# Altium footprint library 1.10-电容.PcbLib: 188 footprints (part 2 of 12)
Each footprint in its own frame and in the unit in brackets; x right, y up, seen from the top. Pads: shape width x height; smd on the part's side, far side on the other; paste and mask are expansions set on the pad; w line width, h text height; cw(c..) or ccw(c..) is an arc to the next point about the centre after c.
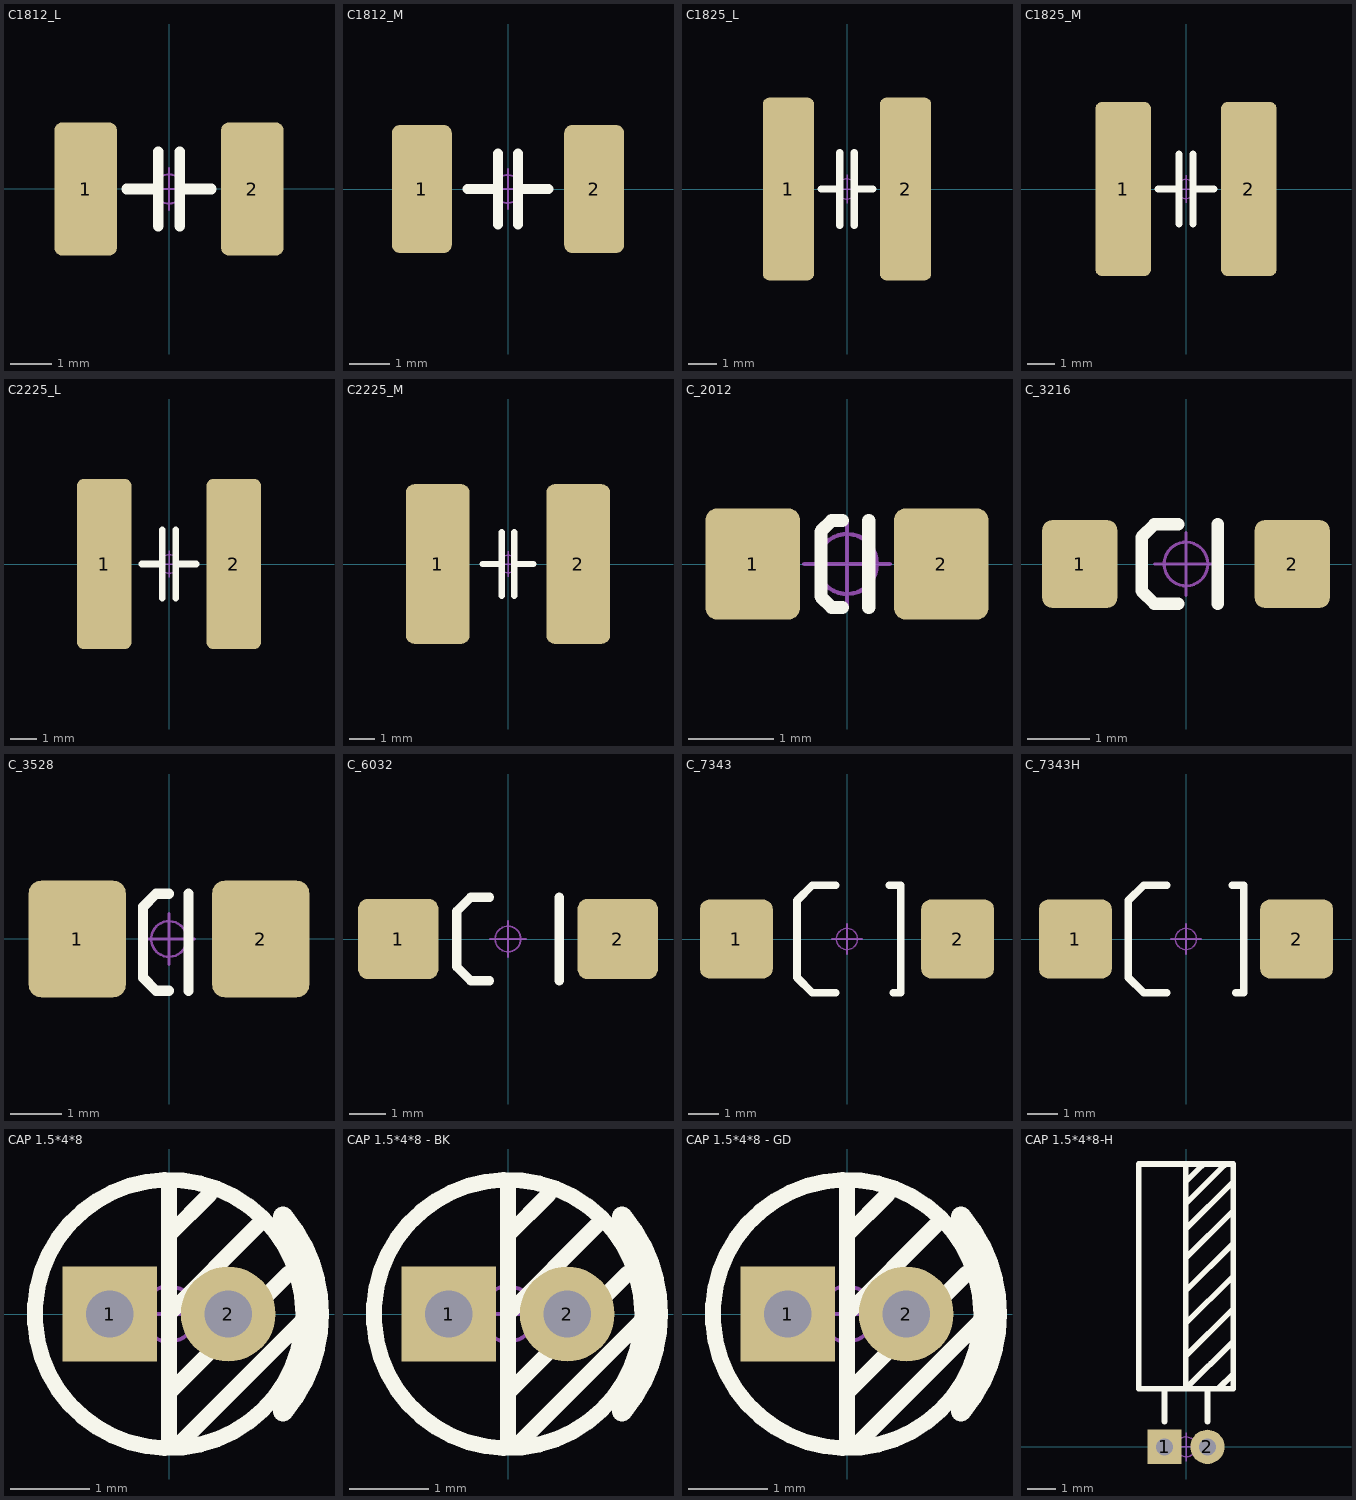
[diagram p1: the footprints below, top view; thin cyan lines are the x and y axes]

## C1812_L [mm] "无极性贴片电容                  淘宝ID:黄晶宝石"
pads (2):
  rrect25% 1.5x3.2 smd: 1(-2,0) 2(2,0)
Top Overlay:
  lines w0.254: -1.016,0 -0.254,0 ; -0.254,-0.889 -0.254,0.889 ; 0.254,-0.889 0.254,0.889 ; 0.254,0 1.016,0
Mechanical 15:
  circle w0.05: c0,0 r0.35
  lines w0.05: -0.5,0 0.5,0 ; 0,-0.5 0,0.5
3D body "C 1812.STEP": height 2.06, standoff 0.04, extent -2.3,-1.61 2.3,1.61

## C1812_M [mm] "无极性贴片电容                  淘宝ID:黄晶宝石"
pads (2):
  rrect25% 1.5x3.2 smd: 1(-2.159,0) 2(2.159,0)
Top Overlay:
  lines w0.254: -1.016,0 -0.254,0 ; -0.254,-0.889 -0.254,0.889 ; 0.254,-0.889 0.254,0.889 ; 0.254,0 1.016,0
Mechanical 15:
  circle w0.05: c0,0 r0.35
  lines w0.05: -0.5,0 0.5,0 ; 0,-0.5 0,0.5
3D body "C 1812.STEP": height 2.06, standoff 0.04, extent -2.3,-1.61 2.3,1.61

## C1825_L [mil] "无极性贴片电容                  淘宝ID:黄晶宝石"
pads (2):
  rrect25% 70x250 smd: 1(-80,0) 2(80,0)
Top Overlay:
  lines w10: -35,0 -10,0 ; -10,-50 -10,50 ; 10,-50 10,50 ; 10,0 35,0
Mechanical 15:
  circle w1.97: c0,0 r13.78
  lines w1.97: -19.68,0 19.68,0 ; 0,-19.68 0,19.68
3D body "C 1825.STEP": height 65.39, standoff 1.61, extent -88.58,-125.39 88.59,125.4

## C1825_M [mil] "无极性贴片电容                  淘宝ID:黄晶宝石"
pads (2):
  rrect25% 80x250 smd: 1(-90,0) 2(90,0)
Top Overlay:
  lines w10: -40,0 -10,0 ; -10,-50 -10,50 ; 10,-50 10,50 ; 10,0 40,0
Mechanical 15:
  circle w1.97: c0,0 r13.78
  lines w1.97: -19.68,0 19.68,0 ; 0,-19.68 0,19.68
3D body "C 1825.STEP": height 65.39, standoff 1.61, extent -88.58,-125.39 88.59,125.4

## C2225_L [mil] "无极性贴片电容                  淘宝ID:黄晶宝石"
pads (2):
  rrect25% 80x250 smd: 1(-95,0) 2(95,0)
Top Overlay:
  lines w10: -40,0 -10,0 ; -10,-50 -10,50 ; 10,-50 10,50 ; 10,0 40,0
Mechanical 15:
  circle w1.97: c0,0 r13.78
  lines w1.97: -19.68,0 19.68,0 ; 0,-19.68 0,19.68
3D body "C 2225.STEP": height 65.39, standoff 1.61, extent -110.23,-125.39 110.24,125.4

## C2225_M [mil] "无极性贴片电容"
pads (2):
  rrect25% 100x250 smd: 1(-110,0) 2(110,0)
Top Overlay:
  lines w10: -40,0 -10,0 ; -10,-50 -10,50 ; 10,-50 10,50 ; 10,0 40,0
Mechanical 15:
  circle w1.97: c0,0 r13.78
  lines w1.97: -19.68,0 19.68,0 ; 0,-19.68 0,19.68
3D body "C 2225.STEP": height 65.39, standoff 1.61, extent -110.23,-125.39 110.24,125.4

## C_2012 [mm] "S型贴片钽电容 长2.0mm，宽1.25mm，厚1.2mm"
pads (2):
  rrect25% 1.1x1.3 smd: 1(-1.1,0) 2(1.1,0)
Top Overlay:
  lines w0.152: -0.051,-0.508 -0.178,-0.508 -0.305,-0.381 -0.305,0.254 -0.305,0.381 -0.178,0.508 -0.051,0.508 ; 0.254,-0.508 0.254,0.508
Mechanical 15:
  circle w0.05: c0,0 r0.35
  lines w0.05: -0.5,0 0.5,0 ; 0,-0.5 0,0.5
3D body "cd_s_2012_.STEP": height 1.24, standoff 0.04, extent -1,-0.6 1.001,0.6

## C_3216 [mm] "A型贴片钽电容 长3.2mm，宽1.6mm，厚1.6mm"
pads (2):
  rrect25% 1.2x1.4 smd: 1(-1.7,0) 2(1.7,0)
Top Overlay:
  lines w0.2: -0.127,-0.635 -0.508,-0.635 -0.711,-0.432 -0.711,0.432 -0.508,0.635 -0.127,0.635 ; 0.508,-0.635 0.508,0.635
Mechanical 15:
  circle w0.05: c0,0 r0.35
  lines w0.05: -0.5,0 0.5,0 ; 0,-0.5 0,0.5
3D body "cd_a_3216__-2 asm.STEP": height 1.63, standoff 0.03, extent -1.6,-0.8 1.6,0.8

## C_3528 [mil] "B型贴片钽电容 长3.5mm，宽2.8mm，厚1.9mm"
pads (2):
  rrect25% 75x90 smd: 1(-70.87,-0.01) 2(70.86,-0.01)
Top Overlay:
  lines w7.87: 0,-40 -10,-40 -20,-30 -20,25 -10,35 0,35 ; 15,-40 15,35
Mechanical 15:
  circle w1.97: c0,0 r13.78
  lines w1.97: -19.68,0 19.68,0 ; 0,-19.68 0,19.68
3D body "cd_b_3528_.STEP": height 75.84, standoff 1, extent -68.91,-55.11 68.92,55.12

## C_6032 [mm] "C型贴片钽电容 长6.0mm，宽3.2mm，厚2.5mm"
pads (2):
  rrect25% 2.2x2.2 smd: 1(-3,0) 2(3,0)
Top Overlay:
  lines w0.254: -0.508,-1.143 -1.016,-1.143 -1.397,-0.762 -1.397,0.762 -1.016,1.143 -0.508,1.143 ; 1.397,-1.143 1.397,1.143
Mechanical 15:
  circle w0.05: c0,0 r0.35
  lines w0.05: -0.5,0 0.5,0 ; 0,-0.5 0,0.5
3D body "cd_c_6032_.STEP": height 2.53, standoff 0.03, extent -3,-1.6 3.001,1.6

## C_7343 [mm] "D型贴片钽电容 长7.3mm，宽4.3mm，厚2.8mm"
pads (2):
  rrect25% 2.4x2.6 smd: 1(-3.65,0) 2(3.65,0)
Top Overlay:
  lines w0.254: -0.381,-1.778 -1.143,-1.778 -1.651,-1.27 -1.651,1.27 -1.143,1.778 -0.381,1.778 ; 1.397,1.778 1.778,1.778 1.778,-1.778 1.524,-1.778
Mechanical 15:
  circle w0.05: c0,0 r0.35
  lines w0.05: -0.5,0 0.5,0 ; 0,-0.5 0,0.5
3D body "cd_d_7343h_.STEP": height 2.83, standoff 0.03, extent -3.65,-2.15 3.651,2.15

## C_7343H [mm] "E型4mm高度贴片钽电容 长7.3mm，宽4.3mm，厚4.0mm"
pads (2):
  rrect25% 2.4x2.6 smd: 1(-3.65,0) 2(3.65,0)
Top Overlay:
  lines w0.254: -0.635,-1.778 -1.397,-1.778 -1.905,-1.27 -1.905,1.27 -1.397,1.778 -0.635,1.778 ; 1.524,1.778 1.905,1.778 1.905,-1.778 1.651,-1.778
Mechanical 15:
  circle w0.05: c0,0 r0.35
  lines w0.05: -0.5,0 0.5,0 ; 0,-0.5 0,0.5
3D body "cd_e_7343h_.STEP": height 4.03, standoff 0.03, extent -3.65,-2.15 3.651,2.15

## CAP 1.5*4*8 [mm] "脚距1.5mm直径4mm高度8mm"
pads (2):
  rect 1.2x1.2 hole 0.6: 1(-0.75,0)
  round 1.2 hole 0.6: 2(0.75,0)
Top Overlay:
  circle w0.2: c0,0 r1.7
  lines w0.2: 0,-1.651 0,1.651 ; 0,-1 1.516,0.516 ; 0,0 1.143,1.143 ; 0,1 0.516,1.516 ; 0.127,-1.651 1.651,-0.127
  lines w0.254: 1.443,-1.236 ccw(c0,0) 1.443,1.236
Mechanical 15:
  circle w0.05: c0,0 r0.35
  lines w0.05: -0.5,0 0.5,0 ; 0,-0.5 0,0.5
3D body "CE_TH_1_5x4x8_.STEP": height 8.15, standoff -3.35, extent -2,-1.999 2.02,2

## CAP 1.5*4*8 - BK [mm] "脚距1.5mm直径4mm高度8mm"
pads (2):
  rect 1.2x1.2 hole 0.6: 1(-0.75,0)
  round 1.2 hole 0.6: 2(0.75,0)
Top Overlay:
  circle w0.2: c0,0 r1.7
  lines w0.2: 0,-1.651 0,1.651 ; 0,-1 1.516,0.516 ; 0,0 1.143,1.143 ; 0,1 0.516,1.516 ; 0.127,-1.651 1.651,-0.127
  lines w0.254: 1.443,-1.236 ccw(c0,0) 1.443,1.236
Mechanical 15:
  circle w0.05: c0,0 r0.35
  lines w0.05: -0.5,0 0.5,0 ; 0,-0.5 0,0.5
3D body "CE_TH_1_5x4x8-6020-2.STEP": height 8.15, standoff -3.35, extent -2,-1.999 2.02,1.999

## CAP 1.5*4*8 - GD [mm] "脚距1.5mm直径4mm高度8mm"
pads (2):
  rect 1.2x1.2 hole 0.6: 1(-0.75,0)
  round 1.2 hole 0.6: 2(0.75,0)
Top Overlay:
  circle w0.2: c0,0 r1.7
  lines w0.2: 0,-1.651 0,1.651 ; 0,-1 1.516,0.516 ; 0,0 1.143,1.143 ; 0,1 0.516,1.516 ; 0.127,-1.651 1.651,-0.127
  lines w0.254: 1.443,-1.236 ccw(c0,0) 1.443,1.236
Mechanical 15:
  circle w0.05: c0,0 r0.35
  lines w0.05: -0.5,0 0.5,0 ; 0,-0.5 0,0.5
3D body "CE_TH_1_5x4x8-4347.STEP": height 8.15, standoff -3.35, extent -2,-1.999 2.02,2

## CAP 1.5*4*8-H [mm] "脚距1.5mm直径4mm高度8mm"
pads (2):
  rect 1.2x1.2 hole 0.6: 1(-0.75,0)
  round 1.2 hole 0.6: 2(0.75,0)
Top Overlay:
  lines w0.2: -0.75,0.889 -0.75,2 ; -0.012,3.175 1.651,4.826 ; -0.012,4.318 1.651,5.969 ; -0.012,5.461 1.651,7.112 ; -0.012,6.604 1.651,8.255 ; -0.012,7.62 1.651,9.271 ; -0.012,8.509 1.328,9.848 ; -0.012,9.271 0.566,9.848 ; -0.012,9.906 -0.012,2.032 ; 0.75,0.889 0.75,2 ; 0.877,2.921 -0.012,2.032 ; 1.131,2.032 1.651,2.54 ; 1.651,3.683 -0.012,2.032 ; -1.651,2.032 1.651,2.032 1.651,9.906 -1.651,9.906 -1.651,2.032
Mechanical 15:
  circle w0.05: c0,0 r0.35
  lines w0.05: -0.5,0 0.5,0 ; 0,-0.5 0,0.5
3D body "CE_TH_1_5x4x8-h_.STEP": height 4.13, standoff -3.37, extent -2,-0.25 2.02,10